# Altium footprint library HW_HOLLAND_NCDM_MONITOR_R1.PcbLib: 472 footprints (part 17 of 30)
Each footprint in its own frame and in the unit in brackets; x right, y up, seen from the top. Pads: shape width x height; smd on the part's side, far side on the other; paste and mask are expansions set on the pad; w line width, h text height; cw(c..) or ccw(c..) is an arc to the next point about the centre after c.
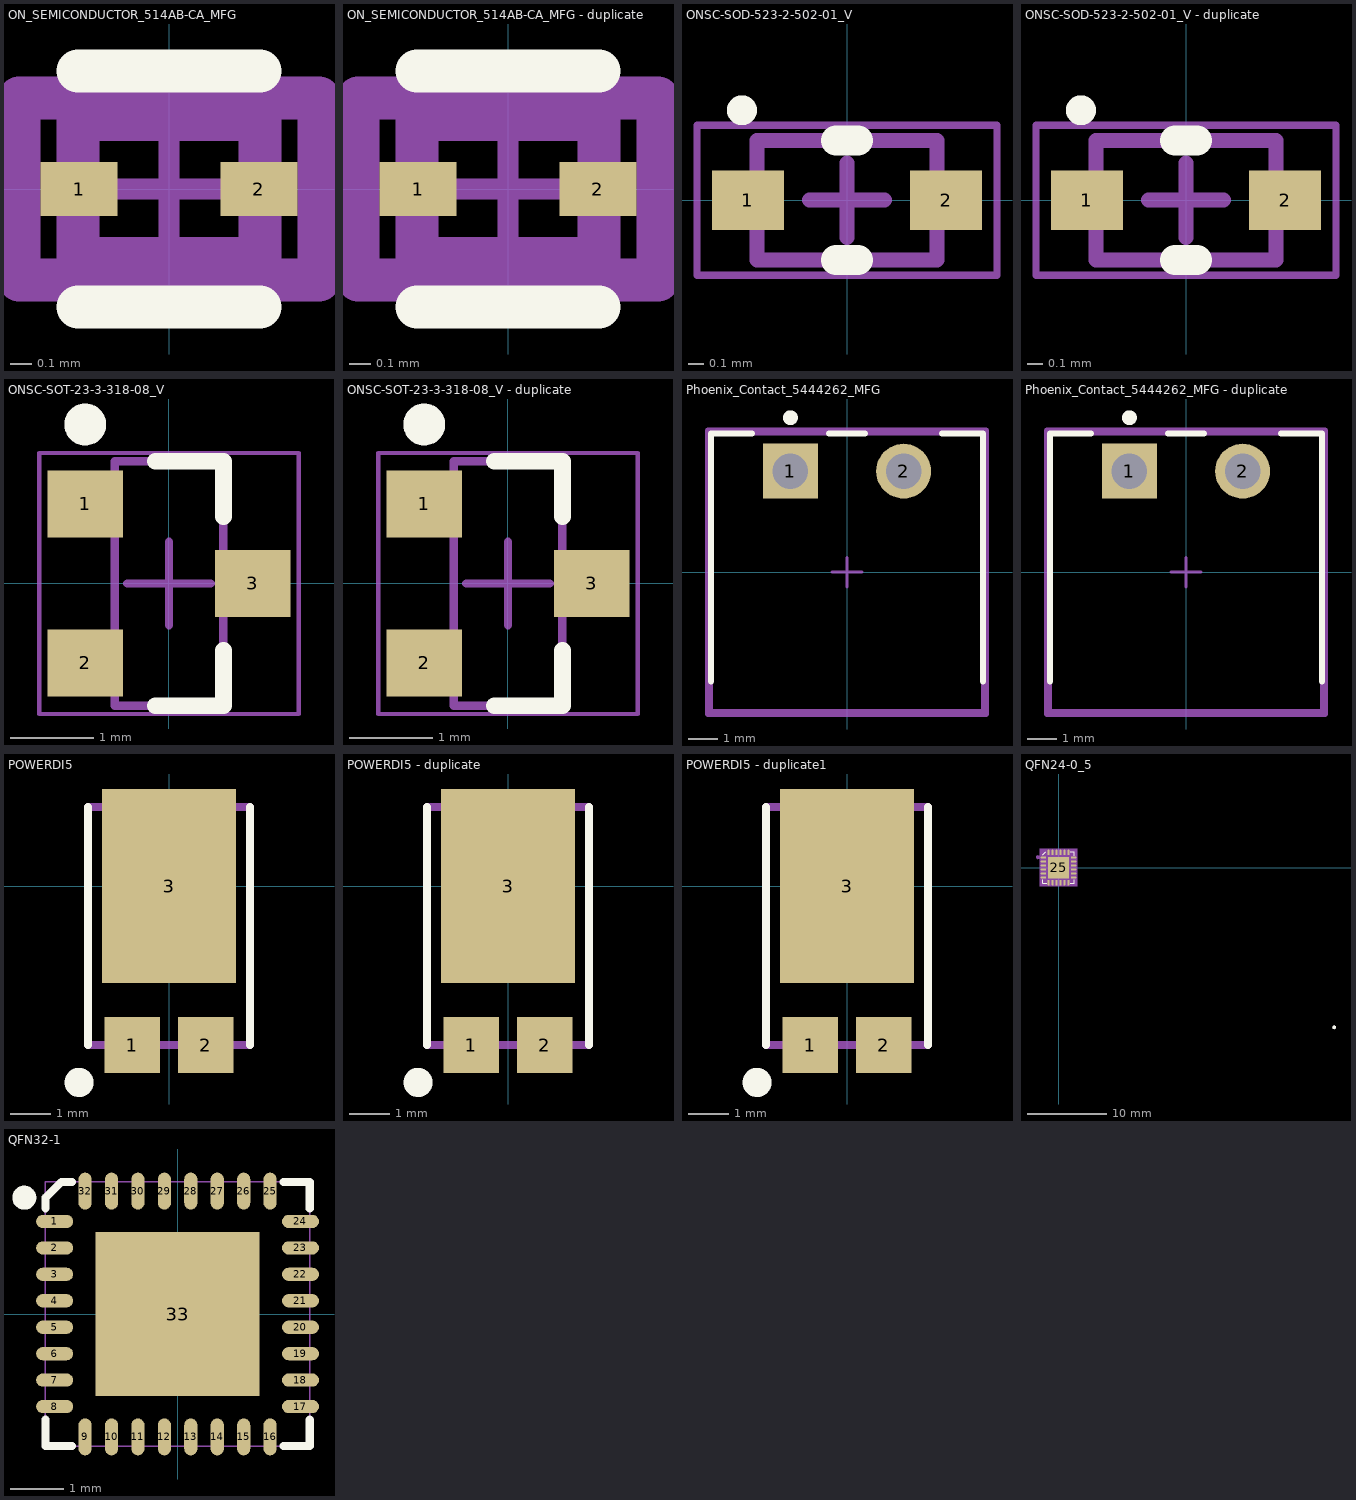
[diagram p16: the footprints below, top view; thin cyan lines are the x and y axes]

## ON_SEMICONDUCTOR_514AB-CA_MFG [mm]
pads (2):
  rect 0.36x0.25 smd paste+0 mask+0: 1(-0.42,0) 2(0.42,0)
Top Overlay:
  lines w0.2: -0.425,-0.55 0.425,-0.55 ; -0.425,0.55 0.425,0.55
Top Courtyard:
  lines w0.2: -0.7,-0.425 -0.7,0.425 0.7,0.425 0.7,-0.425 -0.7,-0.425
  text ".Designator" at 0,0.188 h1
Mechanical 12:
  lines w0.2: -0.425,-0.325 -0.425,0.325 0.425,0.325 0.425,-0.325 -0.425,-0.325
Mechanical 15:
  lines w0.1: -0.5,0 0.5,0 ; 0,-0.5 0,0.5
  lines w0.2: -0.7,-0.425 -0.7,0.425 0.7,0.425 0.7,-0.425 -0.7,-0.425
3D body "Diode_On_Semiconductor_ESD9B5_0ST5G_eec.STEP": height 0.4, standoff 0, extent -0.5,-0.3 0.5,0.3

## ON_SEMICONDUCTOR_514AB-CA_MFG - duplicate [mm]
pads (2):
  rect 0.36x0.25 smd paste+0 mask+0: 1(-0.42,0) 2(0.42,0)
Top Overlay:
  lines w0.2: -0.425,-0.55 0.425,-0.55 ; -0.425,0.55 0.425,0.55
Top Courtyard:
  lines w0.2: -0.7,-0.425 -0.7,0.425 0.7,0.425 0.7,-0.425 -0.7,-0.425
  text ".Designator" at 0,0.188 h1
Mechanical 12:
  lines w0.2: -0.425,-0.325 -0.425,0.325 0.425,0.325 0.425,-0.325 -0.425,-0.325
Mechanical 15:
  lines w0.1: -0.5,0 0.5,0 ; 0,-0.5 0,0.5
  lines w0.2: -0.7,-0.425 -0.7,0.425 0.7,0.425 0.7,-0.425 -0.7,-0.425
3D body "Diode_On_Semiconductor_ESD9B5_0ST5G_eec.STEP": height 0.4, standoff 0, extent -0.5,-0.3 0.5,0.3

## ONSC-SOD-523-2-502-01_V [mm] "SOD, 2-Leads, Body 1.2x0.8mm"
height 0.7
pads (2):
  rect 0.48x0.4 smd: 1(-0.66,0) 2(0.66,0)
Top Overlay:
  circle w0.1: c-0.7,0.6 r0.05
  lines w0.2: -0.074,-0.4 0.074,-0.4 ; -0.074,0.4 0.074,0.4
Mechanical 13:
  lines w0.1: -0.6,-0.4 -0.6,0.4 0.6,0.4 0.6,-0.4 -0.6,-0.4
Mechanical 15:
  lines w0.05: -1,-0.5 1,-0.5 1,0.5 -1,0.5 -1,-0.5
  lines w0.1: -0.25,0 0.25,0 ; 0,-0.25 0,0.25
3D body "SOD-523.STEP": height 0.61, standoff 0, extent -0.913,-0.547 0.913,0.547

## ONSC-SOD-523-2-502-01_V - duplicate [mm] "SOD, 2-Leads, Body 1.2x0.8mm"
height 0.7
pads (2):
  rect 0.48x0.4 smd: 1(-0.66,0) 2(0.66,0)
Top Overlay:
  circle w0.1: c-0.7,0.6 r0.05
  lines w0.2: -0.074,-0.4 0.074,-0.4 ; -0.074,0.4 0.074,0.4
Mechanical 13:
  lines w0.1: -0.6,-0.4 -0.6,0.4 0.6,0.4 0.6,-0.4 -0.6,-0.4
Mechanical 15:
  lines w0.05: -1,-0.5 1,-0.5 1,0.5 -1,0.5 -1,-0.5
  lines w0.1: -0.25,0 0.25,0 ; 0,-0.25 0,0.25
3D body "SOD-523.STEP": height 0.61, standoff 0, extent -0.913,-0.547 0.913,0.547

## ONSC-SOT-23-3-318-08_V [mm]
pads (3):
  rect 0.9x0.8 smd: 1(-1,0.95) 2(-1,-0.95) 3(1,0)
Top Overlay:
  circle w0.25: c-1,1.9 r0.125
  lines w0.2: -0.165,-1.46 0.65,-1.46 0.65,-0.8 ; -0.165,1.46 0.65,1.46 0.65,0.8
Mechanical 13:
  lines w0.1: -0.65,-1.46 -0.65,1.46 0.65,1.46 0.65,-1.46 -0.65,-1.46
Mechanical 15:
  lines w0.05: -1.55,-1.56 -1.55,1.56 1.55,1.56 1.55,-1.56 -1.55,-1.56
  lines w0.1: -0.5,0 0.5,0 ; 0,-0.5 0,0.5
3D body "SOT23-3.step": height 1.1, standoff 0, extent -1.25,-1.5 1.25,1.5

## ONSC-SOT-23-3-318-08_V - duplicate [mm]
pads (3):
  rect 0.9x0.8 smd: 1(-1,0.95) 2(-1,-0.95) 3(1,0)
Top Overlay:
  circle w0.25: c-1,1.9 r0.125
  lines w0.2: -0.165,-1.46 0.65,-1.46 0.65,-0.8 ; -0.165,1.46 0.65,1.46 0.65,0.8
Mechanical 13:
  lines w0.1: -0.65,-1.46 -0.65,1.46 0.65,1.46 0.65,-1.46 -0.65,-1.46
Mechanical 15:
  lines w0.05: -1.55,-1.56 -1.55,1.56 1.55,1.56 1.55,-1.56 -1.55,-1.56
  lines w0.1: -0.5,0 0.5,0 ; 0,-0.5 0,0.5
3D body "SOT23-3.step": height 1.1, standoff 0, extent -1.25,-1.5 1.25,1.5

## PCBComponent_1 [mm]

## PCBComponent_1 - duplicate [mm]

## PCBComponent_1 - duplicate1 [mm]

## Phoenix_Contact_5444262_MFG [mm]
pads (2):
  rect 1.85x1.85 hole 1.2 paste-2539.97 mask+0: 1(-1.905,3.4)
  round 1.85 hole 1.2 paste-2539.97 mask+0: 2(1.905,3.4)
Top Overlay:
  circle w0.25: c-1.905,5.2 r0.125
  lines w0.2: -4.585,-3.675 -4.585,4.675 ; -4.58,4.675 -3.205,4.675 ; -0.605,4.675 0.605,4.675 ; 3.205,4.675 4.58,4.675 ; 4.585,-3.675 4.585,4.675
Top Courtyard:
  lines w0.2: -4.68,-4.775 -4.68,4.775 4.68,4.775 4.68,-4.775 -4.68,-4.775
  text ".Designator" at 0,0 h1
Mechanical 12:
  lines w0.15: -4.58,-4.675 -4.58,4.675 4.58,4.675 4.58,-4.675 -4.58,-4.675
Mechanical 15:
  lines w0.1: -0.5,0 0.5,0 ; 0,-0.5 0,0.5
  lines w0.2: -4.68,-4.775 -4.68,4.775 4.68,4.775 4.68,-4.775 -4.68,-4.775
3D body "Conn_Phoenix_Contact_5444262_eec.STEP": height 0.25, standoff 0, extent -4.68,-4.775 4.68,4.775

## Phoenix_Contact_5444262_MFG - duplicate [mm]
pads (2):
  rect 1.85x1.85 hole 1.2 paste-2539.97 mask+0: 1(-1.905,3.4)
  round 1.85 hole 1.2 paste-2539.97 mask+0: 2(1.905,3.4)
Top Overlay:
  circle w0.25: c-1.905,5.2 r0.125
  lines w0.2: -4.585,-3.675 -4.585,4.675 ; -4.58,4.675 -3.205,4.675 ; -0.605,4.675 0.605,4.675 ; 3.205,4.675 4.58,4.675 ; 4.585,-3.675 4.585,4.675
Top Courtyard:
  lines w0.2: -4.68,-4.775 -4.68,4.775 4.68,4.775 4.68,-4.775 -4.68,-4.775
  text ".Designator" at 0,0 h1
Mechanical 12:
  lines w0.15: -4.58,-4.675 -4.58,4.675 4.58,4.675 4.58,-4.675 -4.58,-4.675
Mechanical 15:
  lines w0.1: -0.5,0 0.5,0 ; 0,-0.5 0,0.5
  lines w0.2: -4.68,-4.775 -4.68,4.775 4.68,4.775 4.68,-4.775 -4.68,-4.775
3D body "Conn_Phoenix_Contact_5444262_eec.STEP": height 0.25, standoff 0, extent -4.68,-4.775 4.68,4.775

## POWERDI5 [mm]
pads (3):
  rect 1.39x1.4 smd: 1(-0.92,-3.982) 2(0.92,-3.982)
  rect 3.36x4.86 smd: 3(0,0)
Top Overlay:
  circle w0.4: c-2.251,-4.917 r0.164
  lines w0.2: -2.025,-3.978 -2.025,1.984 ; 2.025,-3.978 2.025,1.984
Mechanical 13:
  lines w0.2: -2.025,-3.978 -2.025,1.984 2.025,1.984 2.025,-3.978 -2.025,-3.978
3D body "PDS760-13.stp": height 1.05, standoff 0, extent -2.06,-4.54 1.84,1.86

## POWERDI5 - duplicate [mm]
pads (3):
  rect 1.39x1.4 smd: 1(-0.92,-3.982) 2(0.92,-3.982)
  rect 3.36x4.86 smd: 3(0,0)
Top Overlay:
  circle w0.4: c-2.251,-4.917 r0.164
  lines w0.2: -2.025,-3.978 -2.025,1.984 ; 2.025,-3.978 2.025,1.984
Mechanical 13:
  lines w0.2: -2.025,-3.978 2.025,-3.978 2.025,1.984 -2.025,1.984 -2.025,-3.978
3D body "PDS760-13.stp": height 1.05, standoff 0, extent -2.06,-4.54 1.84,1.86

## POWERDI5 - duplicate1 [mm]
height 0.52
pads (3):
  rect 1.39x1.4 smd: 1(-0.92,-3.982) 2(0.92,-3.982)
  rect 3.36x4.86 smd: 3(0,0)
Top Overlay:
  circle w0.4: c-2.251,-4.917 r0.164
  lines w0.2: -2.025,-3.978 -2.025,1.984 ; 2.025,-3.978 2.025,1.984
Mechanical 13:
  lines w0.2: -2.025,-3.978 2.025,-3.978 2.025,1.984 -2.025,1.984 -2.025,-3.978
3D body "PDS760-13.stp": height 1.05, standoff 0, extent -2.06,-4.54 1.84,1.86

## QFN24-0_5 [mm]
pads (25):
  oval 0.7x0.25 smd: 1(-1.9,1.25) 2(-1.9,0.75) 3(-1.9,0.25) 4(-1.9,-0.25) 5(-1.9,-0.75) 6(-1.9,-1.25) 13(1.9,-1.25) 14(1.9,-0.75) 15(1.9,-0.25) 16(1.9,0.25) 17(1.9,0.75) 18(1.9,1.25)
  oval 0.25x0.7 smd: 7(-1.25,-1.9) 8(-0.75,-1.9) 9(-0.25,-1.9) 10(0.25,-1.9) 11(0.75,-1.9) 12(1.25,-1.9) 19(1.25,1.9) 20(0.75,1.9) 21(0.25,1.9) 22(-0.25,1.9) 23(-0.75,1.9) 24(-1.25,1.9)
  rect 2.7x2.7 smd: 25(0,0)
Top Overlay:
  dashed: 34.649,-20.305 34.736,-20.287 34.81,-20.238 34.86,-20.164 34.877,-20.077 34.86,-19.989 34.843,-19.965 34.81,-19.915 34.736,-19.866 34.649,-19.849 34.562,-19.866 34.488,-19.915 34.455,-19.965 34.439,-19.989 34.421,-20.077 34.439,-20.164 34.488,-20.238 34.562,-20.287
  lines w0.152: -2,-1.5 -2,-2 -1.5,-2 ; -2,1.6 -1.6,2 ; 1.5,-2 2,-2 2,-1.5 ; 1.5,2 2,2 2,1.5
  text ".Designator" at -0.953,-0.212 h0.64
Top Assembly:
  dashed: -2.6,1.072 -2.513,1.089 -2.439,1.139 -2.389,1.213 -2.372,1.3 -2.389,1.387 -2.406,1.412 -2.439,1.461 -2.513,1.511 -2.6,1.528 -2.687,1.511 -2.761,1.461 -2.794,1.412 -2.811,1.387 -2.828,1.3 -2.811,1.213 -2.761,1.139 -2.687,1.089
  lines w0.025: -2,-2 2,-2 2,2 1.5,2 -2,2 -2,-2
Top 3D Body:
  region: -2.35,-2.35 -2.35,2.35 2.35,2.35 2.35,-2.35
Mechanical 17:
  text "21" at 0.6,5.101 h2.03
  text "20" at 1.1,5.101 h2.03
  text "3" at -1.9,1.876 h2.03
  text "9" at -0.25,-0.274 h2.03
  text "4" at -1.9,1.376 h2.03
  text "8" at -0.75,-0.274 h2.03
  text "18" at 1.9,4.501 h2.03
  text "10" at 0.25,1.351 h2.03
  text "24" at -0.9,5.101 h2.03
  text "16" at 1.9,3.501 h2.03
  text "22" at 0.1,5.101 h2.03
  text "14" at 1.9,2.501 h2.03
  text "23" at -0.4,5.101 h2.03
  text "15" at 1.9,3.001 h2.03
  text "1" at -1.9,2.876 h2.03
  text "17" at 1.9,4.001 h2.03
  text "19" at 1.6,5.101 h2.03
  text "11" at 0.75,1.351 h2.03
  text "12" at 1.25,1.351 h2.03
  text "13" at 1.9,2.001 h2.03
  text "25" at 0,0.139 h0.46
  text "2" at -1.9,2.376 h2.03
  text "7" at -1.25,-0.274 h2.03
  text "6" at -1.9,0.376 h2.03
  text "5" at -1.9,0.876 h2.03
3D body: height 3.81, standoff 0, extent -2.35,-2.35 2.35,2.35

## QFN32-1 [mm]
pads (33):
  oval 0.7x0.25 smd: 1(-2.325,1.75) 2(-2.325,1.25) 3(-2.325,0.75) 4(-2.325,0.25) 5(-2.325,-0.25) 6(-2.325,-0.75) 7(-2.325,-1.25) 8(-2.325,-1.75) 17(2.325,-1.75) 18(2.325,-1.25) 19(2.325,-0.75) 20(2.325,-0.25) 21(2.325,0.25) 22(2.325,0.75) 23(2.325,1.25) 24(2.325,1.75)
  oval 0.25x0.7 smd: 9(-1.75,-2.325) 10(-1.25,-2.325) 11(-0.75,-2.325) 12(-0.25,-2.325) 13(0.25,-2.325) 14(0.75,-2.325) 15(1.25,-2.325) 16(1.75,-2.325) 25(1.75,2.325) 26(1.25,2.325) 27(0.75,2.325) 28(0.25,2.325) 29(-0.25,2.325) 30(-0.75,2.325) 31(-1.25,2.325) 32(-1.75,2.325)
  rect 3.1x3.1 smd: 33(0,0)
Top Overlay:
  circle w0.254: c-2.9,2.2 r0.1
  lines w0.152: -2.5,-2 -2.5,-2.5 -2,-2.5 ; -2.5,2 -2.5,2.2 -2.2,2.5 -2,2.5 ; 2,-2.5 2.5,-2.5 2.5,-2 ; 2,2.5 2.5,2.5 2.5,2
  text ".Designator" at -2.774,-3.62 h0.76
Top Assembly:
  lines w0.025: -2.5,-2.5 2.5,-2.5 2.5,2.5 -2.5,2.5 -2.5,-2.5
3D body "QFN-32 V6.stp": height 1.05, standoff 0, extent -2.5,-2.5 2.5,2.5